# Altium footprint library DBLib.PcbLib: 97 footprints (part 4 of 7)
Each footprint in its own frame and in the unit in brackets; x right, y up, seen from the top. Pads: shape width x height; smd on the part's side, far side on the other; paste and mask are expansions set on the pad; w line width, h text height; cw(c..) or ccw(c..) is an arc to the next point about the centre after c.
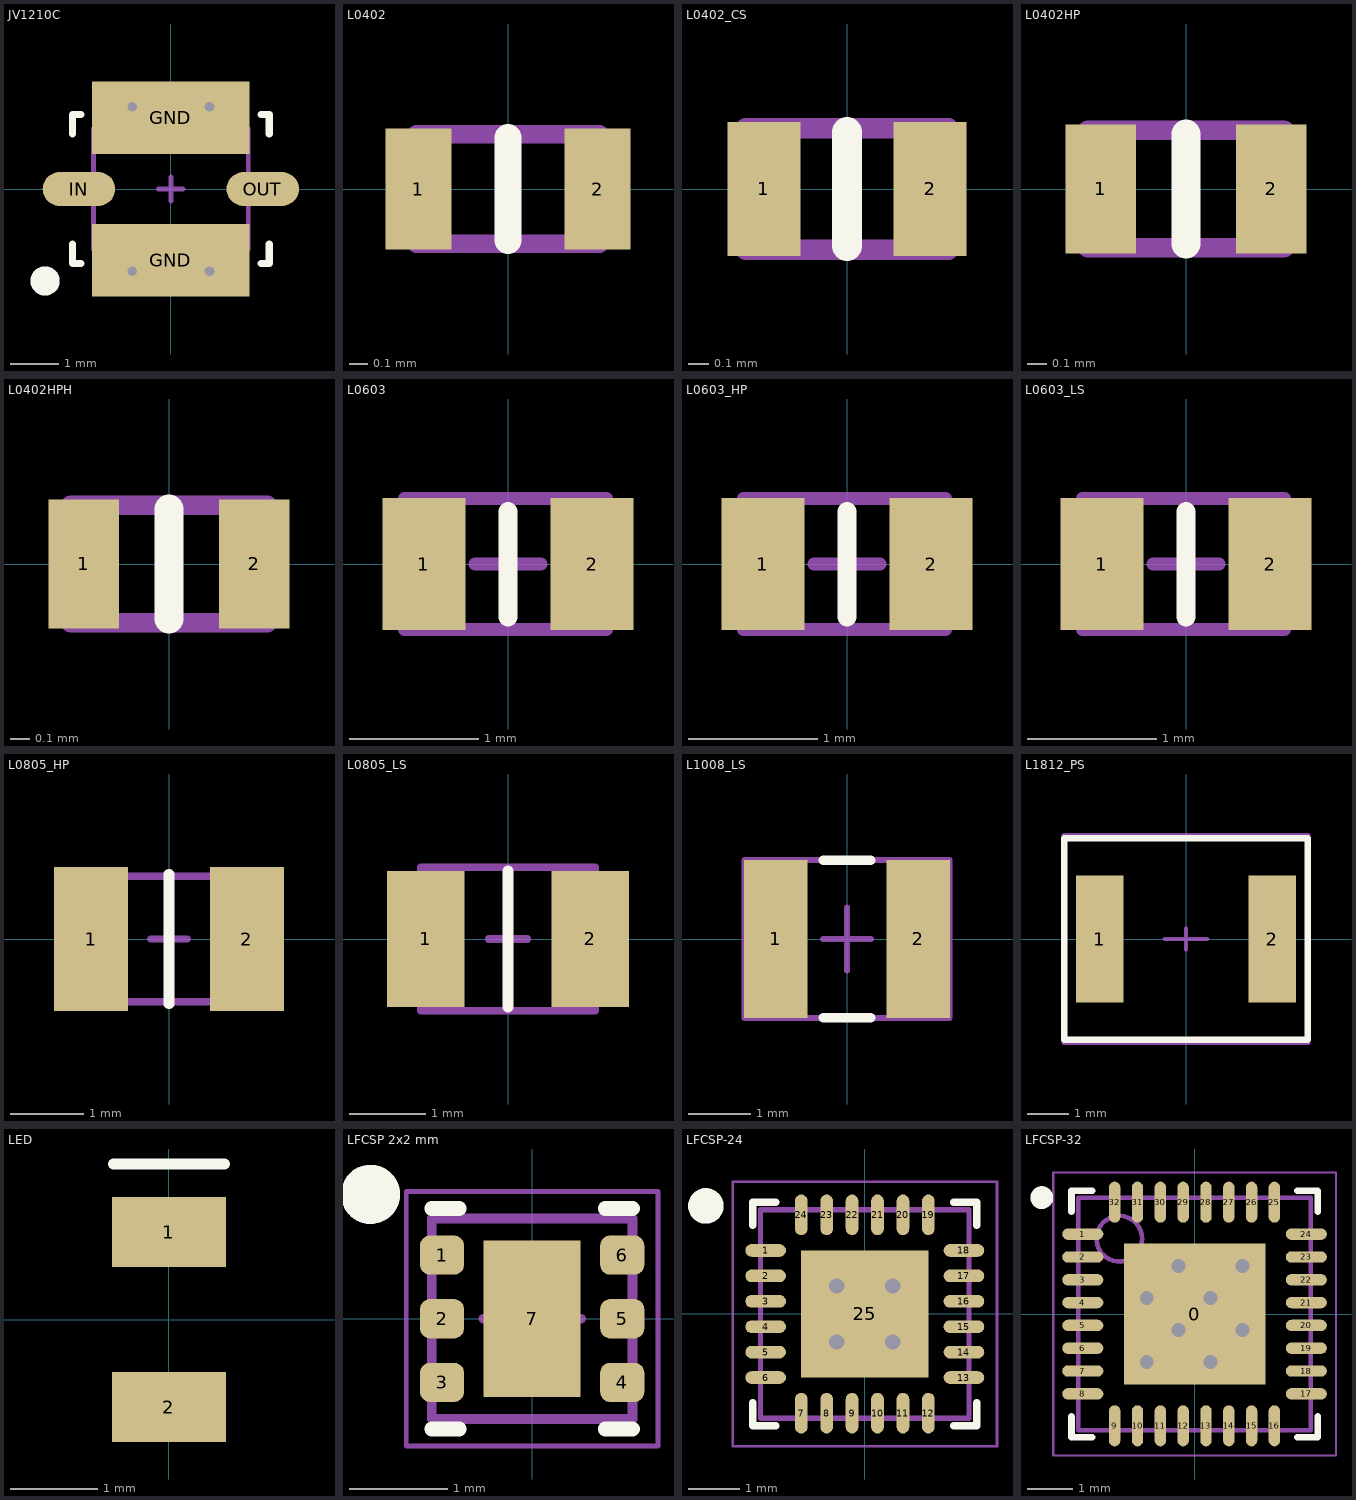
[diagram p3: the footprints below, top view; thin cyan lines are the x and y axes]

## JV1210C [mm] "Bandpass Filter"
height 1.5
pads (4):
  rect 3.25x1.5 smd: GND(0,-1.475) GND(0,1.475)
  oval 1.5x0.7 smd: IN(-1.9,0) OUT(1.9,0)
via 0.8,1.7 diameter 0.5 hole 0.2
via -0.8,1.7 diameter 0.5 hole 0.2
via 0.8,-1.7 diameter 0.5 hole 0.2
via -0.8,-1.7 diameter 0.5 hole 0.2
Top Overlay:
  circle w0.35: c-2.6,-1.9 r0.127
  lines w0.15: -2.032,-1.138 -2.032,-1.538 -1.863,-1.538 ; -2.032,1.138 -2.032,1.538 -1.863,1.538 ; 1.863,-1.538 2.032,-1.538 2.032,-1.138 ; 1.863,1.538 2.032,1.538 2.032,1.138
Mechanical 1:
  lines w0.1: -0.254,0 0.254,0 ; 0,-0.254 0,0.254 ; -1.6,-1.25 1.6,-1.25 1.6,1.25 -1.6,1.25 -1.6,-1.25
3D body "User Library-CAPC3225X13.step": height 1.3, standoff 0, extent -1.6,-1.25 1.6,1.25

## L0402 [mm]
height 1.3
pads (2):
  rect 0.36x0.66 smd: 1(-0.49,0) 2(0.49,0)
Top Overlay:
  lines w0.15: 0,-0.279 0,0.279
Mechanical 1:
  lines w0.1: -0.5,-0.3 0.5,-0.3 0.5,0.3 -0.5,0.3 -0.5,-0.3
3D body "Coilcraft-0402DF.step": height 0.66, standoff 0, extent -0.559,-0.325 0.559,0.335

## L0402_CS [mm]
height 1.3
pads (2):
  rect 0.36x0.66 smd: 1(-0.41,0) 2(0.41,0)
Top Overlay:
  lines w0.15: 0,-0.279 0,0.279
Mechanical 1:
  lines w0.1: -0.5,-0.3 0.5,-0.3 0.5,0.3 -0.5,0.3 -0.5,-0.3
3D body "Coilcraft-0402CS.step": height 0.65, standoff -0.01, extent -0.593,-0.318 0.593,0.318

## L0402HP [mm]
height 1.3
pads (2):
  rect 0.36x0.66 smd: 1(-0.435,0) 2(0.435,0)
Top Overlay:
  lines w0.15: 0,-0.279 0,0.279
Mechanical 1:
  lines w0.1: -0.5,-0.3 -0.5,0.3 0.5,0.3 0.5,-0.3 -0.5,-0.3
3D body "Ind_Coilcraft_0402HP-22NXGLU_eec.STEP": height 0.61, standoff 0, extent -0.546,-0.305 0.546,0.305

## L0402HPH [mm]
height 1.3
pads (2):
  rect 0.36x0.66 smd: 1(-0.435,0) 2(0.435,0)
Top Overlay:
  lines w0.15: 0,-0.279 0,0.279
Mechanical 1:
  lines w0.1: -0.5,-0.3 0.5,-0.3 0.5,0.3 -0.5,0.3 -0.5,-0.3
3D body "Ind_Coilcraft_0402HPH-R10XJLU_eec.STEP": height 0.6, standoff -0.01, extent -0.56,-0.325 0.56,0.335

## L0603 [mm]
height 1.3
pads (2):
  rect 0.64x1.02 smd: 1(-0.65,0) 2(0.65,0)
Top Overlay:
  lines w0.15: 0,-0.406 0,0.406
Mechanical 1:
  lines w0.1: -0.254,0 0.254,0 ; 0,-0.254 0,0.254 ; -0.8,-0.508 0.762,-0.508 0.762,0.508 -0.8,0.508 -0.8,-0.508
3D body "User Library-SLF_0603.step": height 1, standoff -0.02, extent -0.9,-0.56 0.9,0.56

## L0603_HP [mm]
height 1.3
pads (2):
  rect 0.64x1.02 smd: 1(-0.65,0) 2(0.65,0)
Top Overlay:
  lines w0.15: 0,-0.406 0,0.406
Mechanical 1:
  lines w0.1: -0.254,0 0.254,0 ; 0,-0.254 0,0.254 ; -0.8,-0.508 0.762,-0.508 0.762,0.508 -0.8,0.508 -0.8,-0.508
3D body "Coilcraft-0603HP.step": height 0.93, standoff -0.01, extent -0.875,-0.545 0.875,0.545

## L0603_LS [mm]
height 1.3
pads (2):
  rect 0.64x1.02 smd: 1(-0.65,0) 2(0.65,0)
Top Overlay:
  lines w0.15: 0,-0.406 0,0.406
Mechanical 1:
  lines w0.1: -0.254,0 0.254,0 ; 0,-0.254 0,0.254 ; -0.8,-0.508 -0.8,0.508 0.762,0.508 0.762,-0.508 -0.8,-0.508
3D body "Coilcraft-0603LS.step": height 1.11, standoff -0.01, extent -0.901,-0.584 0.901,0.585

## L0805_HP [mm]
height 1.3
pads (2):
  rect 1.02x1.98 smd: 1(-1.07,0) 2(1.07,0)
Top Overlay:
  lines w0.15: 0,-0.889 0,0.889
Mechanical 1:
  lines w0.1: -0.254,0 0.254,0 ; 0,-0.254 0,0.254 ; -1.145,-0.862 1.144,-0.862 1.144,0.863 -1.145,0.863 -1.145,-0.862
3D body "Coilcraft-0805CS.step": height 1.51, standoff -0.01, extent -1.145,-0.862 1.144,0.863

## L0805_LS [mm]
height 1.3
pads (2):
  rect 1.02x1.78 smd: 1(-1.08,0) 2(1.08,0)
Top Overlay:
  lines w0.15: 0,-0.889 0,0.889
Mechanical 1:
  lines w0.1: -0.254,0 0.254,0 ; 0,-0.254 0,0.254 ; -1.145,-0.94 1.144,-0.94 1.144,0.94 -1.145,0.94 -1.145,-0.94
3D body "Coilcraft-0805LS.step": height 1.59, standoff -0.01, extent -1.145,-0.955 1.145,0.955

## L1008_LS [mm]
height 1.3
pads (2):
  rect 1.02x2.54 smd: 1(-1.145,0) 2(1.145,0)
Top Overlay:
  lines w0.15: -0.381,-1.27 0.381,-1.27 ; -0.381,1.27 0.381,1.27
Mechanical 1:
  lines w0.1: -0.381,0 0.381,0 ; 0,-0.508 0,0.508 ; -1.651,-1.27 1.651,-1.27 1.651,1.27 -1.651,1.27 -1.651,-1.27
3D body "Coilcraft-1008LS.step": height 2.02, standoff -0.01, extent -1.46,-1.395 1.46,1.395

## L1812_PS [mm]
height 1.3
pads (2):
  rect 1.14x3.05 smd: 1(-2.07,0) 2(2.07,0)
Top Overlay:
  lines w0.15: -2.921,-2.413 2.921,-2.413 2.921,2.413 -2.921,2.413 -2.921,-2.413
Mechanical 1:
  lines w0.1: -0.508,0 0.508,0 ; 0,-0.254 0,0.254 ; -2.93,-2.49 2.93,-2.49 2.93,2.49 -2.93,2.49 -2.93,-2.49
3D body "Coilcraft-1812PS.step": height 3.8, standoff -0.01, extent -2.93,-2.49 2.93,2.49

## LED [mm] "2012"
pads (2):
  rect 1.3x0.8 smd: 1(0,1) 2(0,-1)
Top Overlay:
  lines w0.127: -0.635,1.778 0.635,1.778
3D body "APHCM2012.STEP": height 0.4, standoff -0.01, extent -0.625,-1 0.625,1

## LFCSP 2x2 mm [mm] "LFCSP, 6-Leads, Body 2,00x2,00mm, Pitch 0,65mm, Thermal Pad 1,60x0,99mm, IPC Medium Density"
height 0.9
pads (7):
  rrect50% 0.45x0.4 smd: 1(-0.92,0.65) 2(-0.92,0) 3(-0.92,-0.65) 4(0.92,-0.65) 5(0.92,0) 6(0.92,0.65)
  rect 0.99x1.6 smd: 7(0,0)
Top Overlay:
  circle w0.35: c-1.651,1.27 r0.127
  lines w0.15: -1.025,-1.125 -0.745,-1.125 ; -1.025,1.125 -0.745,1.125 ; 0.745,-1.125 1.025,-1.125 ; 0.745,1.125 1.025,1.125
Mechanical 1:
  lines w0.05: -1.285,-1.3 1.285,-1.3 1.285,1.3 -1.285,1.3 -1.285,-1.3
  lines w0.1: -0.5,0 0.5,0 ; 0,-0.5 0,0.5 ; -1.025,-1.025 1.025,-1.025 1.025,1.025 -1.025,1.025 -1.025,-1.025
3D body "User Library-LFCSP_UD6.step": height 0.65, standoff 0, extent -1.05,-1.005 1.05,0.995

## LFCSP-24 [mm] "QFN, 24-Leads, Body 4,00x4,00mm, Pitch 0,50mm, Thermal Pad 2,50x2,50mm, IPC Medium Density"
height 0.8
pads (25):
  oval 0.8x0.25 smd: 1(-1.95,1.25) 2(-1.95,0.75) 3(-1.95,0.25) 4(-1.95,-0.25) 5(-1.95,-0.75) 6(-1.95,-1.25) 13(1.95,-1.25) 14(1.95,-0.75) 15(1.95,-0.25) 16(1.95,0.25) 17(1.95,0.75) 18(1.95,1.25)
  oval 0.25x0.8 smd: 7(-1.25,-1.95) 8(-0.75,-1.95) 9(-0.25,-1.95) 10(0.25,-1.95) 11(0.75,-1.95) 12(1.25,-1.95) 19(1.25,1.95) 20(0.75,1.95) 21(0.25,1.95) 22(-0.25,1.95) 23(-0.75,1.95) 24(-1.25,1.95)
  rect 2.5x2.5 all layers, no hole: 25(0,0)
via -0.55,-0.55 diameter 0.6 hole 0.3
via 0.55,-0.55 diameter 0.6 hole 0.3
via 0.55,0.55 diameter 0.6 hole 0.3
via -0.55,0.55 diameter 0.6 hole 0.3
Top Overlay:
  circle w0.35: c-3.125,2.125 r0.175
  lines w0.15: -2.2,-1.75 -2.2,-2.2 -1.75,-2.2 ; -2.2,1.75 -2.2,2.2 -1.75,2.2 ; 1.75,-2.2 2.2,-2.2 2.2,-1.75 ; 1.75,2.2 2.2,2.2 2.2,1.75
Mechanical 1:
  lines w0.05: -2.6,-2.6 2.6,-2.6 2.6,2.6 -2.6,2.6 -2.6,-2.6
  lines w0.1: -2.05,-2.05 2.05,-2.05 2.05,2.05 -2.05,2.05 -2.05,-2.05
Mechanical 15:
  lines w0.1: -0.5,0 0.5,0 ; 0,-0.5 0,0.5
3D body "User Library-LFCSP-24.step": height 0.83, standoff -0.02, extent -1.99,-2.01 2.01,1.99

## LFCSP-32 [mm] "LFCSP, 32-Leads, Body 5,00x5,00mm, Pitch 0,50mm"
height 1.35
pads (33):
  rect 3.1x3.1 all layers, no hole: 0(0,0)
  oval 0.9x0.25 smd: 1(-2.45,1.75) 2(-2.45,1.25) 3(-2.45,0.75) 4(-2.45,0.25) 5(-2.45,-0.25) 6(-2.45,-0.75) 7(-2.45,-1.25) 8(-2.45,-1.75) 17(2.45,-1.75) 18(2.45,-1.25) 19(2.45,-0.75) 20(2.45,-0.25) 21(2.45,0.25) 22(2.45,0.75) 23(2.45,1.25) 24(2.45,1.75)
  oval 0.25x0.9 smd: 9(-1.75,-2.45) 10(-1.25,-2.45) 11(-0.75,-2.45) 12(-0.25,-2.45) 13(0.25,-2.45) 14(0.75,-2.45) 15(1.25,-2.45) 16(1.75,-2.45) 25(1.75,2.45) 26(1.25,2.45) 27(0.75,2.45) 28(0.25,2.45) 29(-0.25,2.45) 30(-0.75,2.45) 31(-1.25,2.45) 32(-1.75,2.45)
via -1.05,-1.05 diameter 0.6 hole 0.3
via -0.35,1.05 diameter 0.6 hole 0.3
via 1.05,1.05 diameter 0.6 hole 0.3
via 0.35,0.35 diameter 0.6 hole 0.3
via -0.35,-0.35 diameter 0.6 hole 0.3
via 1.05,-0.35 diameter 0.6 hole 0.3
via 0.35,-1.05 diameter 0.6 hole 0.3
via -1.05,0.35 diameter 0.6 hole 0.3
Top Overlay:
  circle w0.25: c-3.35,2.55 r0.125
  lines w0.15: -2.7,-2.25 -2.7,-2.7 -2.25,-2.7 ; -2.7,2.25 -2.7,2.7 -2.25,2.7 ; 2.25,-2.7 2.7,-2.7 2.7,-2.25 ; 2.25,2.7 2.7,2.7 2.7,2.25
Mechanical 1:
  circle w0.1: c-1.65,1.65 r0.5
  lines w0.05: -3.1,-3.1 3.1,-3.1 3.1,3.1 -3.1,3.1 -3.1,-3.1
  lines w0.1: -0.5,0 0.5,0 ; 0,-0.5 0,0.5 ; -2.55,-2.55 2.55,-2.55 2.55,2.55 -2.55,2.55 -2.55,-2.55